# Altium footprint library HSD_connectors.PcbLib: 59 footprints (part 1 of 7)
Each footprint in its own frame and in the unit in brackets; x right, y up, seen from the top. Pads: shape width x height; smd on the part's side, far side on the other; paste and mask are expansions set on the pad; w line width, h text height; cw(c..) or ccw(c..) is an arc to the next point about the centre after c.
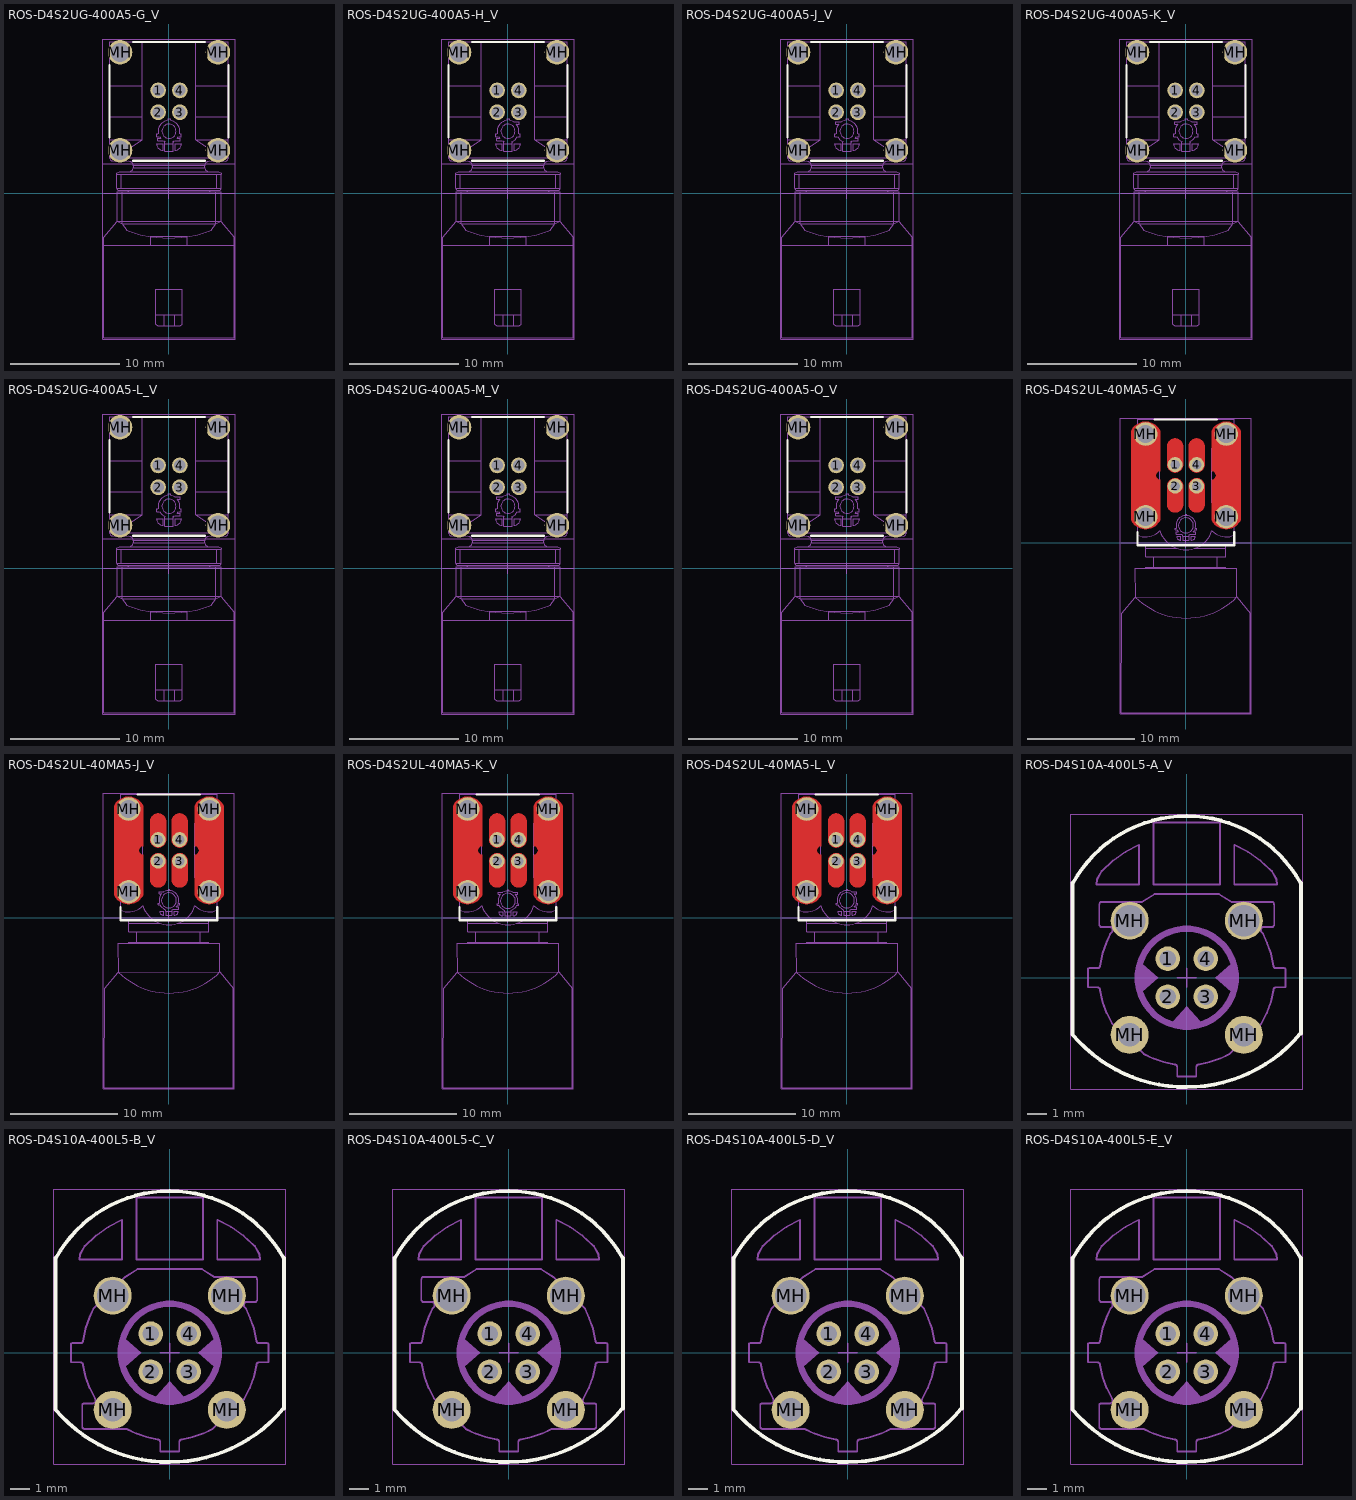
[diagram p0: the footprints below, top view; thin cyan lines are the x and y axes]

## ROS-D4S2UG-400A5-G_V [mm] "HSD Plug, Right Angle, Edge Mount, Upside Down, 27.2x12x10.6mm, Rosenberger Recommended"
height 10.6
pads (8):
  round 1.45 hole 1.05: 1(-1,9.45) 2(-1,7.45) 3(1,7.45) 4(1,9.45)
  round 2.25 hole 1.75: MH(-4.5,3.95) MH(-4.5,12.95) MH(4.5,3.95) MH(4.5,12.95)
Top Overlay:
  lines w0.2: -5.461,5.134 -5.461,11.766 ; -3.316,2.989 3.316,2.989 ; -3.316,13.911 3.316,13.911 ; 5.461,5.134 5.461,11.766
Mechanical 3:
  lines w0.1: -6,0 6,0
  text "Board Edge" at -5.5,-0.5 h0.2
Mechanical 13:
  drawing of 166 lines, arcs and shapes, not listed
  text ".Designator" at -2.274,10.838 h2.69
Mechanical 15:
  lines w0.05: -6.1,2.725 6.096,2.725 ; -6.1,-13.4 -6.1,14.175 6.1,14.175 6.1,-13.4 -6.1,-13.4
  lines w0.1: -0.5,0 0.5,0 ; 0,-0.5 0,0.5
3D body "d4s2ug-400A5-G.stp": height 10.78, standoff -3.37, extent -6,-13.3 6,13.9

## ROS-D4S2UG-400A5-H_V [mm] "HSD Plug, Right Angle, Edge Mount, Upside Down, 27.2x12x10.6mm, Rosenberger Recommended"
height 10.6
pads (8):
  round 1.45 hole 1.05: 1(-1,9.45) 2(-1,7.45) 3(1,7.45) 4(1,9.45)
  round 2.25 hole 1.75: MH(-4.5,3.95) MH(-4.5,12.95) MH(4.5,3.95) MH(4.5,12.95)
Top Overlay:
  lines w0.2: -5.461,5.134 -5.461,11.766 ; -3.316,2.989 3.316,2.989 ; -3.316,13.911 3.316,13.911 ; 5.461,5.134 5.461,11.766
Mechanical 3:
  lines w0.1: -6,0 6,0
  text "Board Edge" at -6,-0.5 h0.2
Mechanical 13:
  drawing of 166 lines, arcs and shapes, not listed
  text ".Designator" at -2.274,11.346 h2.69
Mechanical 15:
  lines w0.05: -6.1,2.725 6.096,2.725 ; -6.1,-13.4 6.1,-13.4 6.1,14.175 -6.1,14.175 -6.1,-13.4
  lines w0.1: -0.5,0 0.5,0 ; 0,-0.5 0,0.5
3D body "d4s2ug-400A5-H.stp": height 10.78, standoff -3.37, extent -6,-13.3 6,13.9

## ROS-D4S2UG-400A5-J_V [mm] "HSD Plug, Right Angle, Edge Mount, Upside Down, 27.2x12x10.6mm, Rosenberger Recommended"
height 10.6
pads (8):
  round 1.45 hole 1.05: 1(-1,9.45) 2(-1,7.45) 3(1,7.45) 4(1,9.45)
  round 2.25 hole 1.75: MH(-4.5,3.95) MH(-4.5,12.95) MH(4.5,3.95) MH(4.5,12.95)
Top Overlay:
  lines w0.2: -5.461,5.134 -5.461,11.766 ; -3.316,2.989 3.316,2.989 ; -3.316,13.911 3.316,13.911 ; 5.461,5.134 5.461,11.766
Mechanical 3:
  lines w0.1: -6,0 6,0
  text "Board Edge" at -6,-0.5 h0.2
Mechanical 13:
  drawing of 166 lines, arcs and shapes, not listed
  text ".Designator" at -2.274,11.346 h2.69
Mechanical 15:
  lines w0.05: -6.1,2.725 6.096,2.725 ; -6.1,-13.4 6.1,-13.4 6.1,14.175 -6.1,14.175 -6.1,-13.4
  lines w0.1: -0.5,0 0.5,0 ; 0,-0.5 0,0.5
3D body "d4s2ug-400A5-J.stp": height 10.78, standoff -3.37, extent -6,-13.3 6,13.9

## ROS-D4S2UG-400A5-K_V [mm] "HSD Plug, Right Angle, Edge Mount, Upside Down, 27.2x12x10.6mm, Rosenberger Recommended"
height 10.6
pads (8):
  round 1.45 hole 1.05: 1(-1,9.45) 2(-1,7.45) 3(1,7.45) 4(1,9.45)
  round 2.25 hole 1.75: MH(-4.5,3.95) MH(-4.5,12.95) MH(4.5,3.95) MH(4.5,12.95)
Top Overlay:
  lines w0.2: -5.461,5.134 -5.461,11.766 ; -3.316,2.989 3.316,2.989 ; -3.316,13.911 3.316,13.911 ; 5.461,5.134 5.461,11.766
Mechanical 3:
  lines w0.1: -6,0 6,0
  text "Board Edge" at -5.5,-0.5 h0.2
Mechanical 13:
  drawing of 166 lines, arcs and shapes, not listed
  text ".Designator" at -2.274,11.219 h2.69
Mechanical 15:
  lines w0.05: -6.1,2.725 6.096,2.725 ; -6.1,-13.4 -6.1,14.175 6.1,14.175 6.1,-13.4 -6.1,-13.4
  lines w0.1: -0.5,0 0.5,0 ; 0,-0.5 0,0.5
3D body "d4s2ug-400A5-K.stp": height 10.78, standoff -3.37, extent -6,-13.3 6,13.9

## ROS-D4S2UG-400A5-L_V [mm] "HSD Plug, Right Angle, Edge Mount, Upside Down, 27.2x12x10.6mm, Rosenberger Recommended"
height 10.6
pads (8):
  round 1.45 hole 1.05: 1(-1,9.45) 2(-1,7.45) 3(1,7.45) 4(1,9.45)
  round 2.25 hole 1.75: MH(-4.5,3.95) MH(-4.5,12.95) MH(4.5,3.95) MH(4.5,12.95)
Top Overlay:
  lines w0.2: -5.461,5.134 -5.461,11.766 ; -3.316,2.989 3.316,2.989 ; -3.316,13.911 3.316,13.911 ; 5.461,5.134 5.461,11.766
Mechanical 3:
  lines w0.1: -6,0 6,0
  text "Board Edge" at -5.5,-0.5 h0.2
Mechanical 13:
  drawing of 166 lines, arcs and shapes, not listed
  text ".Designator" at -2.274,11.219 h2.69
Mechanical 15:
  lines w0.05: -6.1,2.725 6.096,2.725 ; -6.1,-13.4 6.1,-13.4 6.1,14.175 -6.1,14.175 -6.1,-13.4
  lines w0.1: -0.5,0 0.5,0 ; 0,-0.5 0,0.5
3D body "d4s2ug-400A5-L.stp": height 10.78, standoff -3.37, extent -6,-13.3 6,13.9

## ROS-D4S2UG-400A5-M_V [mm] "HSD Plug, Right Angle, Edge Mount, Upside Down, 27.2x12x10.6mm, Rosenberger Recommended"
height 10.6
pads (8):
  round 1.45 hole 1.05: 1(-1,9.45) 2(-1,7.45) 3(1,7.45) 4(1,9.45)
  round 2.25 hole 1.75: MH(-4.5,3.95) MH(-4.5,12.95) MH(4.5,3.95) MH(4.5,12.95)
Top Overlay:
  lines w0.2: -5.461,5.134 -5.461,11.766 ; -3.316,2.989 3.316,2.989 ; -3.316,13.911 3.316,13.911 ; 5.461,5.134 5.461,11.766
Mechanical 3:
  lines w0.1: -6,0 6,0
  text "Board Edge" at -5.5,-0.5 h0.2
Mechanical 13:
  drawing of 166 lines, arcs and shapes, not listed
  text ".Designator" at -2.274,11.473 h2.69
Mechanical 15:
  lines w0.05: -6.1,2.725 6.096,2.725 ; -6.1,-13.4 -6.1,14.175 6.1,14.175 6.1,-13.4 -6.1,-13.4
  lines w0.1: -0.5,0 0.5,0 ; 0,-0.5 0,0.5
3D body "d4s2ug-400A5-M.stp": height 10.78, standoff -3.37, extent -6,-13.3 6,13.9

## ROS-D4S2UG-400A5-O_V [mm] "HSD Plug, Right Angle, Edge Mount, Upside Down, 27.2x12x10.6mm, Rosenberger Recommended"
height 10.6
pads (8):
  round 1.45 hole 1.05: 1(-1,9.45) 2(-1,7.45) 3(1,7.45) 4(1,9.45)
  round 2.25 hole 1.75: MH(-4.5,3.95) MH(-4.5,12.95) MH(4.5,3.95) MH(4.5,12.95)
Top Overlay:
  lines w0.2: -5.461,5.134 -5.461,11.766 ; -3.316,2.989 3.316,2.989 ; -3.316,13.911 3.316,13.911 ; 5.461,5.134 5.461,11.766
Mechanical 3:
  lines w0.1: -6,0 6,0
  text "Board Edge" at -5.5,-0.5 h0.2
Mechanical 13:
  drawing of 172 lines, arcs and shapes, not listed
  text ".Designator" at -2.274,11.346 h2.69
Mechanical 15:
  lines w0.05: -6.1,2.725 6.096,2.725 ; -6.1,-13.4 -6.1,14.175 6.1,14.175 6.1,-13.4 -6.1,-13.4
  lines w0.1: -0.5,0 0.5,0 ; 0,-0.5 0,0.5
3D body "d4s2ug-400A5-O.stp": height 10.78, standoff -3.37, extent -6,-13.3 6,13.9

## ROS-D4S2UL-40MA5-G_V [mm] "HSD Right Angle Plug, Edge Mount Pin in Paste, Upside Down, 27.3x12x6.95mm, Rosenberger Recommended"
height 6.95
pads (8):
  round 1.4 hole 0.9: 1(-1,7.25) 2(-1,5.25) 3(1,5.25) 4(1,7.25)
  round 2.2 hole 1.7: MH(-3.75,2.4) MH(-3.75,10.1) MH(3.75,2.4) MH(3.75,10.1)
Top Layer:
  region: -3.75,1.25 -3.645,1.25 -3.436,1.28 -3.234,1.338 -3.042,1.424 -2.864,1.536 -2.703,1.672 -2.563,1.829 -2.446,2.004 -2.4,2.099 -2.4,5.85 -2.478,5.858 -2.622,5.917 -2.733,6.028 -2.792,6.172 -2.8,6.25 -3.75,6.25
  region: -5.1,6.25 -3.75,6.25 -3.75,1.25 -3.855,1.25 -4.064,1.28 -4.266,1.338 -4.458,1.424 -4.636,1.536 -4.797,1.672 -4.937,1.829 -5.054,2.004 -5.1,2.099
  region: -5.1,6.25 -3.75,6.25 -3.75,11.25 -3.855,11.25 -4.064,11.22 -4.266,11.162 -4.458,11.076 -4.636,10.964 -4.797,10.828 -4.937,10.671 -5.054,10.496 -5.1,10.401
  region: -3.75,11.25 -3.645,11.25 -3.436,11.22 -3.234,11.162 -3.042,11.076 -2.864,10.964 -2.703,10.828 -2.563,10.671 -2.446,10.496 -2.4,10.401 -2.4,6.65 -2.478,6.642 -2.622,6.583 -2.733,6.472 -2.792,6.328 -2.8,6.25 -3.75,6.25
  region: 3.75,11.25 3.645,11.25 3.436,11.22 3.234,11.162 3.042,11.076 2.864,10.964 2.703,10.828 2.563,10.671 2.446,10.496 2.4,10.401 2.4,6.65 2.478,6.642 2.622,6.583 2.733,6.472 2.792,6.328 2.8,6.25 3.75,6.25
  region: 5.1,6.25 3.75,6.25 3.75,11.25 3.855,11.25 4.064,11.22 4.266,11.162 4.458,11.076 4.636,10.964 4.797,10.828 4.937,10.671 5.054,10.496 5.1,10.401
  region: 5.1,6.25 3.75,6.25 3.75,1.25 3.855,1.25 4.064,1.28 4.266,1.338 4.458,1.424 4.636,1.536 4.797,1.672 4.937,1.829 5.054,2.004 5.1,2.099
  region: 3.75,1.25 3.645,1.25 3.436,1.28 3.234,1.338 3.042,1.424 2.864,1.536 2.703,1.672 2.563,1.829 2.446,2.004 2.4,2.099 2.4,5.85 2.478,5.858 2.622,5.917 2.733,6.028 2.792,6.172 2.8,6.25 3.75,6.25
  region: 1.75,8.95 1.75,9.024 1.721,9.169 1.665,9.305 1.583,9.428 1.478,9.533 1.355,9.615 1.219,9.671 1.074,9.7 1,9.7 1,6.5 1.074,6.5 1.219,6.529 1.355,6.585 1.478,6.667 1.583,6.772 1.665,6.895 1.721,7.031 1.75,7.176 1.75,7.25
  region: 0.25,8.95 0.25,9.024 0.279,9.169 0.335,9.305 0.417,9.428 0.522,9.533 0.645,9.615 0.781,9.671 0.926,9.7 1,9.7 1,6.5 0.926,6.5 0.781,6.529 0.645,6.585 0.522,6.667 0.417,6.772 0.335,6.895 0.279,7.031 0.25,7.176 0.25,7.25
  region: -1.75,8.95 -1.75,9.024 -1.721,9.169 -1.665,9.305 -1.583,9.428 -1.478,9.533 -1.355,9.615 -1.219,9.671 -1.074,9.7 -1,9.7 -1,6.5 -1.074,6.5 -1.219,6.529 -1.355,6.585 -1.478,6.667 -1.583,6.772 -1.665,6.895 -1.721,7.031 -1.75,7.176 -1.75,7.25
  region: -0.25,8.95 -0.25,9.024 -0.279,9.169 -0.335,9.305 -0.417,9.428 -0.522,9.533 -0.645,9.615 -0.781,9.671 -0.926,9.7 -1,9.7 -1,6.5 -0.926,6.5 -0.781,6.529 -0.645,6.585 -0.522,6.667 -0.417,6.772 -0.335,6.895 -0.279,7.031 -0.25,7.176 -0.25,7.25
  region: -1.75,3.55 -1.75,3.476 -1.721,3.331 -1.665,3.195 -1.583,3.072 -1.478,2.967 -1.355,2.885 -1.219,2.829 -1.074,2.8 -1,2.8 -1,6 -1.074,6 -1.219,5.971 -1.355,5.915 -1.478,5.833 -1.583,5.728 -1.665,5.605 -1.721,5.469 -1.75,5.324 -1.75,5.25
  region: -0.25,3.55 -0.25,3.476 -0.279,3.331 -0.335,3.195 -0.417,3.072 -0.522,2.967 -0.645,2.885 -0.781,2.829 -0.926,2.8 -1,2.8 -1,6 -0.926,6 -0.781,5.971 -0.645,5.915 -0.522,5.833 -0.417,5.728 -0.335,5.605 -0.279,5.469 -0.25,5.324 -0.25,5.25
  region: 0.25,3.55 0.25,3.476 0.279,3.331 0.335,3.195 0.417,3.072 0.522,2.967 0.645,2.885 0.781,2.829 0.926,2.8 1,2.8 1,6 0.926,6 0.781,5.971 0.645,5.915 0.522,5.833 0.417,5.728 0.335,5.605 0.279,5.469 0.25,5.324 0.25,5.25
  region: 1.75,3.55 1.75,3.476 1.721,3.331 1.665,3.195 1.583,3.072 1.478,2.967 1.355,2.885 1.219,2.829 1.074,2.8 1,2.8 1,6 1.074,6 1.219,5.971 1.355,5.915 1.478,5.833 1.583,5.728 1.665,5.605 1.721,5.469 1.75,5.324 1.75,5.25
Top Overlay:
  lines w0.2: -4.5,0.997 -4.5,-0.248 ; -2.903,11.452 2.903,11.452 ; 4.5,0.997 4.5,-0.248 3.725,-0.248 -3.725,-0.248 -4.5,-0.248 ; -4.5,-0.248 -4.5,-0.248
Top Solder:
  drawing of 8 lines, arcs and shapes, not listed
Mechanical 3:
  lines w0.1: -6,0 6,0
  text "Board Edge" at -5.5,-0.5 h0.2
Mechanical 13:
  circle w0.1: c0,1.598 r0.7
  circle w0.1: c3.75,2.4 r0.675
  circle w0.1: c-3.75,2.4 r0.675
  circle w0.1: c-3.75,10.1 r0.675
  circle w0.1: c3.75,10.1 r0.675
  circle w0.1: c1,5.25 r0.34
  circle w0.1: c1,7.25 r0.34
  circle w0.1: c-1,7.25 r0.34
  circle w0.1: c-1,5.25 r0.34
  lines w0.1: -4.493,0.691 ccw(c-3.75,2.4) -2.42,1.095 ; -4.493,4.109 cw(c-3.75,2.4) -2.42,3.705 -2.42,8.795 cw(c-3.75,10.1) -4.493,8.391 ; -3.725,-2.398 -3.725,-2.298 3.725,-2.298 3.725,-2.398 ; -3.725,-0.548 -0.785,-0.548 ; -3,-2.298 -3,-1.298 ; -2.425,1.094 ccw(c0,1.875) 2.425,1.094 ; 0.785,-0.548 3.725,-0.548 ; 2.42,1.095 ccw(c3.75,2.4) 4.493,0.691 ; 2.898,-2.298 2.898,-1.298 ; 4.493,4.109 ccw(c3.75,2.4) 2.42,3.705 2.42,8.795 ccw(c3.75,10.1) 4.493,8.391 ; 5.842,-15.848 5.969,-15.848 ; 5.983,-6.575 4.742,-5.047 4.75,-2.398 -4.75,-2.398 -4.717,-5.068 ; 6,-6.575 6,-15.848 -6,-15.848 -5.983,-6.575 -4.717,-5.068 ; -4.717,-5.068 ccw(c0.008,-0.329) 4.747,-5.053 -4.717,-5.068 ; -3.725,-0.248 -4.5,-0.248 -4.5,11.452 4.5,11.452 4.5,-0.248 3.725,-0.248 ; -3.725,-0.248 -3.725,-1.298 -3,-1.298 ; -3.725,-0.248 3.725,-0.248 ; -3,-1.298 2.898,-1.298 ; -0.285,0.598 -0.285,0.223 0.285,0.223 0.285,0.598 ; -0.285,0.598 -0.285,0.721 cw(c0,1.598) -0.458,0.798 -0.9,0.798 -0.9,0.998 -0.7,0.998 cw(c0,1.598) -0.831,1.198 -1,1.198 -1,1.348 -0.887,1.348 cw(c0,1.598) -0.075,2.517 -0.075,2.63 0.075,2.63 0.075,2.517 cw(c0,1.598) 0.887,1.348 1,1.348 1,1.198 0.831,1.198 cw(c0,1.598) 0.7,0.998 0.9,0.998 0.9,0.798 0.458,0.798 cw(c0,1.598) 0.285,0.721 0.285,0.598 ; -0.285,0.598 0.285,0.598 ; 2.898,-1.298 3.725,-1.298 3.725,-0.248 ; -0.875,0.598 ccw(c-0.5,0.598) -0.5,0.223 -0.5,0.598 -0.875,0.598 ; 0.5,0.223 ccw(c0.5,0.598) 0.875,0.598 0.5,0.598 0.5,0.223
  text ".Designator" at -3.417,-4.529 h2.69
Mechanical 15:
  lines w0.05: 6.1,-15.949 -6.1,-15.948 -6.1,11.552 6.1,11.552 6.1,-15.948
  lines w0.1: -0.5,0 0.5,0 ; 0,-0.5 0,0.5
3D body "d4s2ul-40mA5-G.stp": height 8.1, standoff -6.05, extent -6,-15.9 6,11.4

## ROS-D4S2UL-40MA5-J_V [mm] "HSD Right Angle Plug, Edge Mount Pin in Paste, Upside Down, 27.3x12x6.95mm, Rosenberger Recommended"
height 6.95
pads (8):
  round 1.4 hole 0.9: 1(-1,7.25) 2(-1,5.25) 3(1,5.25) 4(1,7.25)
  round 2.2 hole 1.7: MH(-3.75,2.4) MH(-3.75,10.1) MH(3.75,2.4) MH(3.75,10.1)
Top Layer:
  region: 1.75,3.55 1.75,3.476 1.721,3.331 1.665,3.195 1.583,3.072 1.478,2.967 1.355,2.885 1.219,2.829 1.074,2.8 1,2.8 1,6 1.074,6 1.219,5.971 1.355,5.915 1.478,5.833 1.583,5.728 1.665,5.605 1.721,5.469 1.75,5.324 1.75,5.25
  region: 0.25,3.55 0.25,3.476 0.279,3.331 0.335,3.195 0.417,3.072 0.522,2.967 0.645,2.885 0.781,2.829 0.926,2.8 1,2.8 1,6 0.926,6 0.781,5.971 0.645,5.915 0.522,5.833 0.417,5.728 0.335,5.605 0.279,5.469 0.25,5.324 0.25,5.25
  region: -0.25,3.55 -0.25,3.476 -0.279,3.331 -0.335,3.195 -0.417,3.072 -0.522,2.967 -0.645,2.885 -0.781,2.829 -0.926,2.8 -1,2.8 -1,6 -0.926,6 -0.781,5.971 -0.645,5.915 -0.522,5.833 -0.417,5.728 -0.335,5.605 -0.279,5.469 -0.25,5.324 -0.25,5.25
  region: -1.75,3.55 -1.75,3.476 -1.721,3.331 -1.665,3.195 -1.583,3.072 -1.478,2.967 -1.355,2.885 -1.219,2.829 -1.074,2.8 -1,2.8 -1,6 -1.074,6 -1.219,5.971 -1.355,5.915 -1.478,5.833 -1.583,5.728 -1.665,5.605 -1.721,5.469 -1.75,5.324 -1.75,5.25
  region: -0.25,8.95 -0.25,9.024 -0.279,9.169 -0.335,9.305 -0.417,9.428 -0.522,9.533 -0.645,9.615 -0.781,9.671 -0.926,9.7 -1,9.7 -1,6.5 -0.926,6.5 -0.781,6.529 -0.645,6.585 -0.522,6.667 -0.417,6.772 -0.335,6.895 -0.279,7.031 -0.25,7.176 -0.25,7.25
  region: -1.75,8.95 -1.75,9.024 -1.721,9.169 -1.665,9.305 -1.583,9.428 -1.478,9.533 -1.355,9.615 -1.219,9.671 -1.074,9.7 -1,9.7 -1,6.5 -1.074,6.5 -1.219,6.529 -1.355,6.585 -1.478,6.667 -1.583,6.772 -1.665,6.895 -1.721,7.031 -1.75,7.176 -1.75,7.25
  region: 0.25,8.95 0.25,9.024 0.279,9.169 0.335,9.305 0.417,9.428 0.522,9.533 0.645,9.615 0.781,9.671 0.926,9.7 1,9.7 1,6.5 0.926,6.5 0.781,6.529 0.645,6.585 0.522,6.667 0.417,6.772 0.335,6.895 0.279,7.031 0.25,7.176 0.25,7.25
  region: 1.75,8.95 1.75,9.024 1.721,9.169 1.665,9.305 1.583,9.428 1.478,9.533 1.355,9.615 1.219,9.671 1.074,9.7 1,9.7 1,6.5 1.074,6.5 1.219,6.529 1.355,6.585 1.478,6.667 1.583,6.772 1.665,6.895 1.721,7.031 1.75,7.176 1.75,7.25
  region: 3.75,1.25 3.645,1.25 3.436,1.28 3.234,1.338 3.042,1.424 2.864,1.536 2.703,1.672 2.563,1.829 2.446,2.004 2.4,2.099 2.4,5.85 2.478,5.858 2.622,5.917 2.733,6.028 2.792,6.172 2.8,6.25 3.75,6.25
  region: 5.1,6.25 3.75,6.25 3.75,1.25 3.855,1.25 4.064,1.28 4.266,1.338 4.458,1.424 4.636,1.536 4.797,1.672 4.937,1.829 5.054,2.004 5.1,2.099
  region: 5.1,6.25 3.75,6.25 3.75,11.25 3.855,11.25 4.064,11.22 4.266,11.162 4.458,11.076 4.636,10.964 4.797,10.828 4.937,10.671 5.054,10.496 5.1,10.401
  region: 3.75,11.25 3.645,11.25 3.436,11.22 3.234,11.162 3.042,11.076 2.864,10.964 2.703,10.828 2.563,10.671 2.446,10.496 2.4,10.401 2.4,6.65 2.478,6.642 2.622,6.583 2.733,6.472 2.792,6.328 2.8,6.25 3.75,6.25
  region: -3.75,11.25 -3.645,11.25 -3.436,11.22 -3.234,11.162 -3.042,11.076 -2.864,10.964 -2.703,10.828 -2.563,10.671 -2.446,10.496 -2.4,10.401 -2.4,6.65 -2.478,6.642 -2.622,6.583 -2.733,6.472 -2.792,6.328 -2.8,6.25 -3.75,6.25
  region: -5.1,6.25 -3.75,6.25 -3.75,11.25 -3.855,11.25 -4.064,11.22 -4.266,11.162 -4.458,11.076 -4.636,10.964 -4.797,10.828 -4.937,10.671 -5.054,10.496 -5.1,10.401
  region: -5.1,6.25 -3.75,6.25 -3.75,1.25 -3.855,1.25 -4.064,1.28 -4.266,1.338 -4.458,1.424 -4.636,1.536 -4.797,1.672 -4.937,1.829 -5.054,2.004 -5.1,2.099
  region: -3.75,1.25 -3.645,1.25 -3.436,1.28 -3.234,1.338 -3.042,1.424 -2.864,1.536 -2.703,1.672 -2.563,1.829 -2.446,2.004 -2.4,2.099 -2.4,5.85 -2.478,5.858 -2.622,5.917 -2.733,6.028 -2.792,6.172 -2.8,6.25 -3.75,6.25
Top Overlay:
  lines w0.2: -4.5,0.997 -4.5,-0.248 ; -2.903,11.452 2.903,11.452 ; 4.5,0.997 4.5,-0.248 3.725,-0.248 -3.725,-0.248 -4.5,-0.248 ; -4.5,-0.248 -4.5,-0.248
Mechanical 3:
  lines w0.1: -6,0 6,0
  text "Board Edge" at -5.5,-0.5 h0.2
Mechanical 13:
  circle w0.1: c0,1.598 r0.7
  circle w0.1: c3.75,2.4 r0.675
  circle w0.1: c-3.75,2.4 r0.675
  circle w0.1: c-3.75,10.1 r0.675
  circle w0.1: c3.75,10.1 r0.675
  circle w0.1: c1,5.25 r0.34
  circle w0.1: c1,7.25 r0.34
  circle w0.1: c-1,7.25 r0.34
  circle w0.1: c-1,5.25 r0.34
  lines w0.1: -4.493,0.691 ccw(c-3.75,2.4) -2.42,1.095 ; -4.493,4.109 cw(c-3.75,2.4) -2.42,3.705 -2.42,8.795 cw(c-3.75,10.1) -4.493,8.391 ; -3.725,-2.398 -3.725,-2.298 3.725,-2.298 3.725,-2.398 ; -3.725,-0.548 -0.785,-0.548 ; -3,-2.298 -3,-1.298 ; -2.425,1.094 ccw(c0,1.875) 2.425,1.094 ; 0.785,-0.548 3.725,-0.548 ; 2.42,1.095 ccw(c3.75,2.4) 4.493,0.691 ; 2.898,-2.298 2.898,-1.298 ; 4.493,4.109 ccw(c3.75,2.4) 2.42,3.705 2.42,8.795 ccw(c3.75,10.1) 4.493,8.391 ; 5.842,-15.848 5.969,-15.848 ; 5.983,-6.575 4.742,-5.047 4.75,-2.398 -4.75,-2.398 -4.717,-5.068 ; 6,-6.575 6,-15.848 -6,-15.848 -5.983,-6.575 -4.717,-5.068 ; -4.717,-5.068 ccw(c0.008,-0.329) 4.747,-5.053 -4.717,-5.068 ; -3.725,-0.248 -4.5,-0.248 -4.5,11.452 4.5,11.452 4.5,-0.248 3.725,-0.248 ; -3.725,-0.248 -3.725,-1.298 -3,-1.298 ; -3.725,-0.248 3.725,-0.248 ; -3,-1.298 2.898,-1.298 ; -0.285,0.598 -0.285,0.223 0.285,0.223 0.285,0.598 ; -0.285,0.598 -0.285,0.721 cw(c0,1.598) -0.831,1.198 -1,1.198 -1,1.348 -0.887,1.348 cw(c0,1.598) -0.7,2.198 -0.9,2.198 -0.9,2.398 -0.458,2.398 cw(c0,1.598) -0.075,2.517 -0.075,2.63 0.075,2.63 0.075,2.517 cw(c0,1.598) 0.887,1.348 1,1.348 1,1.198 0.831,1.198 cw(c0,1.598) 0.7,0.998 0.9,0.998 0.9,0.798 0.458,0.798 cw(c0,1.598) 0.285,0.721 0.285,0.598 ; -0.285,0.598 0.285,0.598 ; 2.898,-1.298 3.725,-1.298 3.725,-0.248 ; -0.875,0.598 ccw(c-0.5,0.598) -0.5,0.223 -0.5,0.598 -0.875,0.598 ; 0.5,0.223 ccw(c0.5,0.598) 0.875,0.598 0.5,0.598 0.5,0.223
  text ".Designator" at -3.544,-4.402 h2.69
Mechanical 15:
  lines w0.05: 6.1,-15.949 -6.1,-15.948 -6.1,11.552 6.1,11.552 6.1,-15.948
  lines w0.1: -0.5,0 0.5,0 ; 0,-0.5 0,0.5
3D body "d4s2ul-40mA5-J.stp": height 8.1, standoff -6.05, extent -6,-15.9 6,11.4

## ROS-D4S2UL-40MA5-K_V [mm] "HSD Right Angle Plug, Edge Mount Pin in Paste, Upside Down, 27.3x12x6.95mm, Rosenberger Recommended"
height 6.95
pads (8):
  round 1.4 hole 0.9: 1(-1,7.25) 2(-1,5.25) 3(1,5.25) 4(1,7.25)
  round 2.2 hole 1.7: MH(-3.75,2.4) MH(-3.75,10.1) MH(3.75,2.4) MH(3.75,10.1)
Top Layer:
  region: 1.75,3.55 1.75,3.476 1.721,3.331 1.665,3.195 1.583,3.072 1.478,2.967 1.355,2.885 1.219,2.829 1.074,2.8 1,2.8 1,6 1.074,6 1.219,5.971 1.355,5.915 1.478,5.833 1.583,5.728 1.665,5.605 1.721,5.469 1.75,5.324 1.75,5.25
  region: 0.25,3.55 0.25,3.476 0.279,3.331 0.335,3.195 0.417,3.072 0.522,2.967 0.645,2.885 0.781,2.829 0.926,2.8 1,2.8 1,6 0.926,6 0.781,5.971 0.645,5.915 0.522,5.833 0.417,5.728 0.335,5.605 0.279,5.469 0.25,5.324 0.25,5.25
  region: -0.25,3.55 -0.25,3.476 -0.279,3.331 -0.335,3.195 -0.417,3.072 -0.522,2.967 -0.645,2.885 -0.781,2.829 -0.926,2.8 -1,2.8 -1,6 -0.926,6 -0.781,5.971 -0.645,5.915 -0.522,5.833 -0.417,5.728 -0.335,5.605 -0.279,5.469 -0.25,5.324 -0.25,5.25
  region: -1.75,3.55 -1.75,3.476 -1.721,3.331 -1.665,3.195 -1.583,3.072 -1.478,2.967 -1.355,2.885 -1.219,2.829 -1.074,2.8 -1,2.8 -1,6 -1.074,6 -1.219,5.971 -1.355,5.915 -1.478,5.833 -1.583,5.728 -1.665,5.605 -1.721,5.469 -1.75,5.324 -1.75,5.25
  region: -0.25,8.95 -0.25,9.024 -0.279,9.169 -0.335,9.305 -0.417,9.428 -0.522,9.533 -0.645,9.615 -0.781,9.671 -0.926,9.7 -1,9.7 -1,6.5 -0.926,6.5 -0.781,6.529 -0.645,6.585 -0.522,6.667 -0.417,6.772 -0.335,6.895 -0.279,7.031 -0.25,7.176 -0.25,7.25
  region: -1.75,8.95 -1.75,9.024 -1.721,9.169 -1.665,9.305 -1.583,9.428 -1.478,9.533 -1.355,9.615 -1.219,9.671 -1.074,9.7 -1,9.7 -1,6.5 -1.074,6.5 -1.219,6.529 -1.355,6.585 -1.478,6.667 -1.583,6.772 -1.665,6.895 -1.721,7.031 -1.75,7.176 -1.75,7.25
  region: 0.25,8.95 0.25,9.024 0.279,9.169 0.335,9.305 0.417,9.428 0.522,9.533 0.645,9.615 0.781,9.671 0.926,9.7 1,9.7 1,6.5 0.926,6.5 0.781,6.529 0.645,6.585 0.522,6.667 0.417,6.772 0.335,6.895 0.279,7.031 0.25,7.176 0.25,7.25
  region: 1.75,8.95 1.75,9.024 1.721,9.169 1.665,9.305 1.583,9.428 1.478,9.533 1.355,9.615 1.219,9.671 1.074,9.7 1,9.7 1,6.5 1.074,6.5 1.219,6.529 1.355,6.585 1.478,6.667 1.583,6.772 1.665,6.895 1.721,7.031 1.75,7.176 1.75,7.25
  region: 3.75,1.25 3.645,1.25 3.436,1.28 3.234,1.338 3.042,1.424 2.864,1.536 2.703,1.672 2.563,1.829 2.446,2.004 2.4,2.099 2.4,5.85 2.478,5.858 2.622,5.917 2.733,6.028 2.792,6.172 2.8,6.25 3.75,6.25
  region: 5.1,6.25 3.75,6.25 3.75,1.25 3.855,1.25 4.064,1.28 4.266,1.338 4.458,1.424 4.636,1.536 4.797,1.672 4.937,1.829 5.054,2.004 5.1,2.099
  region: 5.1,6.25 3.75,6.25 3.75,11.25 3.855,11.25 4.064,11.22 4.266,11.162 4.458,11.076 4.636,10.964 4.797,10.828 4.937,10.671 5.054,10.496 5.1,10.401
  region: 3.75,11.25 3.645,11.25 3.436,11.22 3.234,11.162 3.042,11.076 2.864,10.964 2.703,10.828 2.563,10.671 2.446,10.496 2.4,10.401 2.4,6.65 2.478,6.642 2.622,6.583 2.733,6.472 2.792,6.328 2.8,6.25 3.75,6.25
  region: -3.75,11.25 -3.645,11.25 -3.436,11.22 -3.234,11.162 -3.042,11.076 -2.864,10.964 -2.703,10.828 -2.563,10.671 -2.446,10.496 -2.4,10.401 -2.4,6.65 -2.478,6.642 -2.622,6.583 -2.733,6.472 -2.792,6.328 -2.8,6.25 -3.75,6.25
  region: -5.1,6.25 -3.75,6.25 -3.75,11.25 -3.855,11.25 -4.064,11.22 -4.266,11.162 -4.458,11.076 -4.636,10.964 -4.797,10.828 -4.937,10.671 -5.054,10.496 -5.1,10.401
  region: -5.1,6.25 -3.75,6.25 -3.75,1.25 -3.855,1.25 -4.064,1.28 -4.266,1.338 -4.458,1.424 -4.636,1.536 -4.797,1.672 -4.937,1.829 -5.054,2.004 -5.1,2.099
  region: -3.75,1.25 -3.645,1.25 -3.436,1.28 -3.234,1.338 -3.042,1.424 -2.864,1.536 -2.703,1.672 -2.563,1.829 -2.446,2.004 -2.4,2.099 -2.4,5.85 -2.478,5.858 -2.622,5.917 -2.733,6.028 -2.792,6.172 -2.8,6.25 -3.75,6.25
Top Overlay:
  lines w0.2: -4.5,0.997 -4.5,-0.248 ; -2.903,11.452 2.903,11.452 ; 4.5,0.997 4.5,-0.248 3.725,-0.248 -3.725,-0.248 -4.5,-0.248 ; -4.5,-0.248 -4.5,-0.248
Top Solder:
  drawing of 8 lines, arcs and shapes, not listed
Mechanical 3:
  lines w0.1: -6,0 6,0
  text "Board Edge" at -5.5,-0.5 h0.2
Mechanical 13:
  circle w0.1: c0,1.55 r0.7
  circle w0.1: c-1,5.25 r0.34
  circle w0.1: c-1,7.25 r0.34
  circle w0.1: c1,7.25 r0.34
  circle w0.1: c1,5.25 r0.34
  circle w0.1: c3.75,10.1 r0.675
  circle w0.1: c-3.75,10.1 r0.675
  circle w0.1: c-3.75,2.4 r0.675
  circle w0.1: c3.75,2.4 r0.675
  lines w0.1: -4.493,0.691 ccw(c-3.75,2.4) -2.42,1.095 ; -4.493,4.109 cw(c-3.75,2.4) -2.42,3.705 -2.42,8.795 cw(c-3.75,10.1) -4.493,8.391 ; -3.725,-2.398 -3.725,-2.298 3.725,-2.298 3.725,-2.398 ; -3.725,-0.548 -0.785,-0.548 ; -3,-2.298 -3,-1.298 ; -2.425,1.094 ccw(c0,1.875) 2.425,1.094 ; 0.785,-0.548 3.725,-0.548 ; 2.42,1.095 ccw(c3.75,2.4) 4.493,0.691 ; 2.898,-2.298 2.898,-1.298 ; 4.493,4.109 ccw(c3.75,2.4) 2.42,3.705 2.42,8.795 ccw(c3.75,10.1) 4.493,8.391 ; 5.842,-15.848 5.969,-15.848 ; 5.983,-6.575 4.742,-5.047 4.75,-2.398 -4.75,-2.398 -4.717,-5.068 ; 6,-6.575 6,-15.848 -6,-15.848 -5.983,-6.575 -4.717,-5.068 ; -4.717,-5.068 ccw(c0.008,-0.329) 4.747,-5.053 -4.717,-5.068 ; -3.725,-0.248 3.725,-0.248 ; -3.725,-0.248 -3.725,-1.298 -3,-1.298 ; -3.725,-0.248 -4.5,-0.248 -4.5,11.452 4.5,11.452 4.5,-0.248 3.725,-0.248 ; -3,-1.298 2.898,-1.298 ; -0.285,0.55 -0.285,0.175 0.285,0.175 0.285,0.55 ; -0.285,0.55 -0.285,0.673 cw(c0,1.55) -0.831,1.15 -1,1.15 -1,1.3 -0.887,1.3 cw(c0,1.55) -0.7,2.15 -0.9,2.15 -0.9,2.35 -0.458,2.35 cw(c0,1.55) -0.075,2.469 -0.075,2.582 0.075,2.582 0.075,2.469 cw(c0,1.55) 0.458,2.35 0.9,2.35 0.9,2.15 0.7,2.15 cw(c0,1.55) 0.887,1.3 1,1.3 1,1.15 0.831,1.15 cw(c0,1.55) 0.285,0.673 0.285,0.55 ; -0.285,0.55 0.285,0.55 ; 2.898,-1.298 3.725,-1.298 3.725,-0.248 ; -0.875,0.55 ccw(c-0.5,0.55) -0.5,0.175 -0.5,0.55 -0.875,0.55 ; 0.5,0.175 ccw(c0.5,0.55) 0.875,0.55 0.5,0.55 0.5,0.175
  text ".Designator" at -3.544,-4.402 h2.69
Mechanical 15:
  lines w0.05: 6.1,-15.949 -6.1,-15.948 -6.1,11.552 6.1,11.552 6.1,-15.948
  lines w0.1: -0.5,0 0.5,0 ; 0,-0.5 0,0.5
3D body "d4s2ul-40mA5-K.stp": height 8.1, standoff -6.05, extent -6,-15.9 6,11.4

## ROS-D4S2UL-40MA5-L_V [mm] "HSD Right Angle Plug, Edge Mount Pin in Paste, Upside Down, 27.3x12x6.95mm, Rosenberger Recommended"
height 6.95
pads (8):
  round 1.4 hole 0.9: 1(-1,7.25) 2(-1,5.25) 3(1,5.25) 4(1,7.25)
  round 2.2 hole 1.7: MH(-3.75,2.4) MH(-3.75,10.1) MH(3.75,2.4) MH(3.75,10.1)
Top Layer:
  region: 1.75,3.55 1.75,3.476 1.721,3.331 1.665,3.195 1.583,3.072 1.478,2.967 1.355,2.885 1.219,2.829 1.074,2.8 1,2.8 1,6 1.074,6 1.219,5.971 1.355,5.915 1.478,5.833 1.583,5.728 1.665,5.605 1.721,5.469 1.75,5.324 1.75,5.25
  region: 0.25,3.55 0.25,3.476 0.279,3.331 0.335,3.195 0.417,3.072 0.522,2.967 0.645,2.885 0.781,2.829 0.926,2.8 1,2.8 1,6 0.926,6 0.781,5.971 0.645,5.915 0.522,5.833 0.417,5.728 0.335,5.605 0.279,5.469 0.25,5.324 0.25,5.25
  region: -0.25,3.55 -0.25,3.476 -0.279,3.331 -0.335,3.195 -0.417,3.072 -0.522,2.967 -0.645,2.885 -0.781,2.829 -0.926,2.8 -1,2.8 -1,6 -0.926,6 -0.781,5.971 -0.645,5.915 -0.522,5.833 -0.417,5.728 -0.335,5.605 -0.279,5.469 -0.25,5.324 -0.25,5.25
  region: -1.75,3.55 -1.75,3.476 -1.721,3.331 -1.665,3.195 -1.583,3.072 -1.478,2.967 -1.355,2.885 -1.219,2.829 -1.074,2.8 -1,2.8 -1,6 -1.074,6 -1.219,5.971 -1.355,5.915 -1.478,5.833 -1.583,5.728 -1.665,5.605 -1.721,5.469 -1.75,5.324 -1.75,5.25
  region: -0.25,8.95 -0.25,9.024 -0.279,9.169 -0.335,9.305 -0.417,9.428 -0.522,9.533 -0.645,9.615 -0.781,9.671 -0.926,9.7 -1,9.7 -1,6.5 -0.926,6.5 -0.781,6.529 -0.645,6.585 -0.522,6.667 -0.417,6.772 -0.335,6.895 -0.279,7.031 -0.25,7.176 -0.25,7.25
  region: -1.75,8.95 -1.75,9.024 -1.721,9.169 -1.665,9.305 -1.583,9.428 -1.478,9.533 -1.355,9.615 -1.219,9.671 -1.074,9.7 -1,9.7 -1,6.5 -1.074,6.5 -1.219,6.529 -1.355,6.585 -1.478,6.667 -1.583,6.772 -1.665,6.895 -1.721,7.031 -1.75,7.176 -1.75,7.25
  region: 0.25,8.95 0.25,9.024 0.279,9.169 0.335,9.305 0.417,9.428 0.522,9.533 0.645,9.615 0.781,9.671 0.926,9.7 1,9.7 1,6.5 0.926,6.5 0.781,6.529 0.645,6.585 0.522,6.667 0.417,6.772 0.335,6.895 0.279,7.031 0.25,7.176 0.25,7.25
  region: 1.75,8.95 1.75,9.024 1.721,9.169 1.665,9.305 1.583,9.428 1.478,9.533 1.355,9.615 1.219,9.671 1.074,9.7 1,9.7 1,6.5 1.074,6.5 1.219,6.529 1.355,6.585 1.478,6.667 1.583,6.772 1.665,6.895 1.721,7.031 1.75,7.176 1.75,7.25
  region: 3.75,1.25 3.645,1.25 3.436,1.28 3.234,1.338 3.042,1.424 2.864,1.536 2.703,1.672 2.563,1.829 2.446,2.004 2.4,2.099 2.4,5.85 2.478,5.858 2.622,5.917 2.733,6.028 2.792,6.172 2.8,6.25 3.75,6.25
  region: 5.1,6.25 3.75,6.25 3.75,1.25 3.855,1.25 4.064,1.28 4.266,1.338 4.458,1.424 4.636,1.536 4.797,1.672 4.937,1.829 5.054,2.004 5.1,2.099
  region: 5.1,6.25 3.75,6.25 3.75,11.25 3.855,11.25 4.064,11.22 4.266,11.162 4.458,11.076 4.636,10.964 4.797,10.828 4.937,10.671 5.054,10.496 5.1,10.401
  region: 3.75,11.25 3.645,11.25 3.436,11.22 3.234,11.162 3.042,11.076 2.864,10.964 2.703,10.828 2.563,10.671 2.446,10.496 2.4,10.401 2.4,6.65 2.478,6.642 2.622,6.583 2.733,6.472 2.792,6.328 2.8,6.25 3.75,6.25
  region: -3.75,11.25 -3.645,11.25 -3.436,11.22 -3.234,11.162 -3.042,11.076 -2.864,10.964 -2.703,10.828 -2.563,10.671 -2.446,10.496 -2.4,10.401 -2.4,6.65 -2.478,6.642 -2.622,6.583 -2.733,6.472 -2.792,6.328 -2.8,6.25 -3.75,6.25
  region: -5.1,6.25 -3.75,6.25 -3.75,11.25 -3.855,11.25 -4.064,11.22 -4.266,11.162 -4.458,11.076 -4.636,10.964 -4.797,10.828 -4.937,10.671 -5.054,10.496 -5.1,10.401
  region: -5.1,6.25 -3.75,6.25 -3.75,1.25 -3.855,1.25 -4.064,1.28 -4.266,1.338 -4.458,1.424 -4.636,1.536 -4.797,1.672 -4.937,1.829 -5.054,2.004 -5.1,2.099
  region: -3.75,1.25 -3.645,1.25 -3.436,1.28 -3.234,1.338 -3.042,1.424 -2.864,1.536 -2.703,1.672 -2.563,1.829 -2.446,2.004 -2.4,2.099 -2.4,5.85 -2.478,5.858 -2.622,5.917 -2.733,6.028 -2.792,6.172 -2.8,6.25 -3.75,6.25
Top Overlay:
  lines w0.2: -4.5,0.997 -4.5,-0.248 ; -2.903,11.452 2.903,11.452 ; 4.5,0.997 4.5,-0.248 3.725,-0.248 -3.725,-0.248 -4.5,-0.248 ; -4.5,-0.248 -4.5,-0.248
Top Solder:
  drawing of 8 lines, arcs and shapes, not listed
Mechanical 3:
  lines w0.1: -6,0 6,0
  text "Board Edge" at -5.5,-1 h0.2
Mechanical 13:
  circle w0.1: c-1,5.25 r0.34
  circle w0.1: c-1,7.25 r0.34
  circle w0.1: c1,7.25 r0.34
  circle w0.1: c1,5.25 r0.34
  circle w0.1: c3.75,10.1 r0.675
  circle w0.1: c-3.75,10.1 r0.675
  circle w0.1: c-3.75,2.4 r0.675
  circle w0.1: c3.75,2.4 r0.675
  circle w0.1: c0,1.598 r0.7
  lines w0.1: -4.493,0.691 ccw(c-3.75,2.4) -2.42,1.095 ; -4.493,4.109 cw(c-3.75,2.4) -2.42,3.705 -2.42,8.795 cw(c-3.75,10.1) -4.493,8.391 ; -3.725,-2.398 -3.725,-2.298 3.725,-2.298 3.725,-2.398 ; -3.725,-0.548 -0.785,-0.548 ; -3,-2.298 -3,-1.298 ; -2.425,1.094 ccw(c0,1.875) 2.425,1.094 ; 0.785,-0.548 3.725,-0.548 ; 2.42,1.095 ccw(c3.75,2.4) 4.493,0.691 ; 2.898,-2.298 2.898,-1.298 ; 4.493,4.109 ccw(c3.75,2.4) 2.42,3.705 2.42,8.795 ccw(c3.75,10.1) 4.493,8.391 ; 5.842,-15.848 5.969,-15.848 ; 5.983,-6.575 4.742,-5.047 4.75,-2.398 -4.75,-2.398 -4.717,-5.068 ; 6,-6.575 6,-15.848 -6,-15.848 -5.983,-6.575 -4.717,-5.068 ; -4.717,-5.068 ccw(c0.008,-0.329) 4.747,-5.053 -4.717,-5.068 ; -3.725,-0.248 3.725,-0.248 ; -3.725,-0.248 -3.725,-1.298 -3,-1.298 ; -3.725,-0.248 -4.5,-0.248 -4.5,11.452 4.5,11.452 4.5,-0.248 3.725,-0.248 ; -3,-1.298 2.898,-1.298 ; -0.285,0.598 0.285,0.598 ; -0.285,0.598 -0.285,0.721 cw(c0,1.598) -0.831,1.198 -1,1.198 -1,1.348 -0.887,1.348 cw(c0,1.598) -0.075,2.517 -0.075,2.63 0.075,2.63 0.075,2.517 cw(c0,1.598) 0.458,2.398 0.9,2.398 0.9,2.198 0.7,2.198 cw(c0,1.598) 0.922,1.598 cw(c0,1.598) 0.887,1.348 1,1.348 1,1.198 0.831,1.198 cw(c0,1.598) 0.7,0.998 0.9,0.998 0.9,0.798 0.458,0.798 cw(c0,1.598) 0.285,0.721 0.285,0.598 ; -0.285,0.598 -0.285,0.223 0.285,0.223 0.285,0.598 ; 2.898,-1.298 3.725,-1.298 3.725,-0.248 ; -0.875,0.598 ccw(c-0.5,0.598) -0.5,0.223 -0.5,0.598 -0.875,0.598 ; 0.5,0.223 ccw(c0.5,0.598) 0.875,0.598 0.5,0.598 0.5,0.223
  text ".Designator" at -3.925,-4.529 h2.69
Mechanical 15:
  lines w0.05: 6.1,-15.949 -6.1,-15.948 -6.1,11.552 6.1,11.552 6.1,-15.948
  lines w0.1: -0.5,0 0.5,0 ; 0,-0.5 0,0.5
3D body "d4s2ul-40mA5-L.stp": height 8.1, standoff -6.05, extent -6,-15.9 6,11.4

## ROS-D4S10A-400L5-A_V [mm] "HSD Straight Plug, 12x14.15x15.4mm, Rosenberger Recommended"
height 15.4
pads (8):
  round 1.3 hole 0.85: 1(-1,1) 2(-1,-1) 3(1,-1) 4(1,1)
  round 2 hole 1.25: MH(-3,-3) MH(3,-3)
  round 2 hole 1.65: MH(-3,3) MH(3,3)
Top Overlay:
  lines w0.2: -6,4.989 -6,-3 ccw(c-0.039,2.086) 5.965,-2.95 ; -5.98,4.989 cw(c0,1.651) 5.981,4.989 ; 6,-2.95 6,4.989
Mechanical 13:
  drawing of 99 lines, arcs and shapes, not listed
  text ".Designator" at -1.639,5.885 h2.69
Mechanical 15:
  lines w0.05: -6.1,-5.85 6.1,-5.85 6.1,8.6 -6.1,8.6 -6.1,-5.85
  lines w0.1: -0.5,0 0.5,0 ; 0,-0.5 0,0.5
3D body "d4s10a-400L5-A.stp": height 15.25, standoff -3.5, extent -6,-5.649 6,8.501

## ROS-D4S10A-400L5-B_V [mm] "HSD Straight Plug, 12x14.15x15.4mm, Rosenberger Recommended"
height 15.4
pads (8):
  round 1.3 hole 0.85: 1(-1,1) 2(-1,-1) 3(1,-1) 4(1,1)
  round 2 hole 1.25: MH(-3,-3) MH(3,-3)
  round 2 hole 1.65: MH(-3,3) MH(3,3)
Top Overlay:
  lines w0.2: -6,4.989 -6,-3 ccw(c-0.039,2.086) 5.965,-2.95 ; -5.98,4.989 cw(c0,1.651) 5.981,4.989 ; 6,-2.95 6,4.989
Mechanical 13:
  drawing of 100 lines, arcs and shapes, not listed
  text ".Designator" at -1.639,5.504 h2.69
Mechanical 15:
  lines w0.05: -6.1,-5.85 6.1,-5.85 6.1,8.6 -6.1,8.6 -6.1,-5.85
  lines w0.1: -0.5,0 0.5,0 ; 0,-0.5 0,0.5
3D body "d4s10a-400L5-B.stp": height 15.25, standoff -3.5, extent -6,-5.65 6,8.5

## ROS-D4S10A-400L5-C_V [mm] "HSD Straight Plug, 12x14.15x15.4mm, Rosenberger Recommended"
height 15.4
pads (8):
  round 1.3 hole 0.85: 1(-1,1) 2(-1,-1) 3(1,-1) 4(1,1)
  round 2 hole 1.25: MH(-3,-3) MH(3,-3)
  round 2 hole 1.65: MH(-3,3) MH(3,3)
Top Overlay:
  lines w0.2: -6,4.989 -6,-3 ccw(c-0.039,2.086) 5.965,-2.95 ; -5.98,4.989 cw(c0,1.651) 5.981,4.989 ; 6,-2.95 6,4.989
Mechanical 13:
  drawing of 99 lines, arcs and shapes, not listed
  text ".Designator" at -1.512,5.631 h2.69
Mechanical 15:
  lines w0.05: -6.1,-5.85 -6.1,8.6 6.1,8.6 6.1,-5.85 -6.1,-5.85
  lines w0.1: -0.5,0 0.5,0 ; 0,-0.5 0,0.5
3D body "d4s10a-400L5-C.stp": height 15.25, standoff -3.5, extent -6,-5.65 6,8.5

## ROS-D4S10A-400L5-D_V [mm] "HSD Straight Plug, 12x14.15x15.4mm, Rosenberger Recommended"
height 15.4
pads (8):
  round 1.3 hole 0.85: 1(-1,1) 2(-1,-1) 3(1,-1) 4(1,1)
  round 2 hole 1.25: MH(-3,-3) MH(3,-3)
  round 2 hole 1.65: MH(-3,3) MH(3,3)
Top Overlay:
  lines w0.2: -6,4.989 -6,-3 ccw(c-0.039,2.086) 5.965,-2.95 ; -5.98,4.989 cw(c0,1.651) 5.981,4.989 ; 6,-2.95 6,4.989
Mechanical 13:
  drawing of 99 lines, arcs and shapes, not listed
  text ".Designator" at -1.512,5.631 h2.69
Mechanical 15:
  lines w0.05: -6.1,-5.85 6.1,-5.85 6.1,8.6 -6.1,8.6 -6.1,-5.85
  lines w0.1: -0.5,0 0.5,0 ; 0,-0.5 0,0.5
3D body "d4s10a-400L5-D.stp": height 15.25, standoff -3.5, extent -6,-5.65 6,8.5

## ROS-D4S10A-400L5-E_V [mm] "HSD Straight Plug, 12x14.15x15.4mm, Rosenberger Recommended"
height 15.4
pads (8):
  round 1.3 hole 0.85: 1(-1,1) 2(-1,-1) 3(1,-1) 4(1,1)
  round 2 hole 1.25: MH(-3,-3) MH(3,-3)
  round 2 hole 1.65: MH(-3,3) MH(3,3)
Top Overlay:
  lines w0.2: -6,4.989 -6,-3 ccw(c-0.039,2.086) 5.965,-2.95 ; -5.98,4.989 cw(c0,1.651) 5.981,4.989 ; 6,-2.95 6,4.989
Mechanical 13:
  drawing of 99 lines, arcs and shapes, not listed
  text ".Designator" at -1.512,5.631 h2.69
Mechanical 15:
  lines w0.05: -6.1,-5.85 -6.1,8.6 6.1,8.6 6.1,-5.85 -6.1,-5.85
  lines w0.1: -0.5,0 0.5,0 ; 0,-0.5 0,0.5
3D body "d4s10a-400L5-E.stp": height 15.25, standoff -3.5, extent -6,-5.65 6,8.5